# Altium schematic symbol library jlcpcb_2025_04_resistors_extended_1210.schlib: 2670 symbols (part 10 of 14) (continued)
## RC1210FR-071K5L
designator R?  Resistance: 1.5kΩ  (hidden comment: *)
Resistor, 1.5kΩ, ±1%, 500mW, 200V, ±100ppm/℃, -55℃~+155℃, SMD 1210; Manufacturer: Uniroyal; Manufacturer Part Number: RC1210FR-071K5L; Supplier 1: LCSC; Supplier Part Number 1: C309587; JLCPCB Part Number: C309587; Power Rating: 500mW; Category: Resistors; Package Size: 1210; JLCPCB Basic Part: Yes; Tolerance: ±1%; Voltage Rating: 200V; Temperature Coefficient: ±100ppm/℃; Temperature Rating: -55℃~+155℃; ComponentLink1Description: Datasheet; ComponentLink1URL: https://wmsc.lcsc.com/wmsc/upload/file/pdf/v2/lcsc/2304140030_YAGEO-RC1210FR-071K5L_C309587.pdf; ComponentLink2Description: JLCPCB Part URL; ComponentLink2URL: https://jlcpcb.com/partdetail/C309587
pins: 1, 2
1 alternate drawing of the same symbol

## RC1210FR-071K6L
designator R?  Resistance: 1.6kΩ  (hidden comment: *)
Resistor, 1.6kΩ, ±1%, 500mW, 200V, ±100ppm/℃, -55℃~+155℃, SMD 1210; Manufacturer: Uniroyal; Manufacturer Part Number: RC1210FR-071K6L; Supplier 1: LCSC; Supplier Part Number 1: C723540; JLCPCB Part Number: C723540; Power Rating: 500mW; Category: Resistors; Package Size: 1210; JLCPCB Basic Part: Yes; Tolerance: ±1%; Voltage Rating: 200V; Temperature Coefficient: ±100ppm/℃; Temperature Rating: -55℃~+155℃; ComponentLink1Description: Datasheet; ComponentLink1URL: https://wmsc.lcsc.com/wmsc/upload/file/pdf/v2/lcsc/2008171307_YAGEO-RC1210FR-071K6L_C723540.pdf; ComponentLink2Description: JLCPCB Part URL; ComponentLink2URL: https://jlcpcb.com/partdetail/C723540
pins: 1, 2
1 alternate drawing of the same symbol

## RC1210FR-071K8L
designator R?  Resistance: 1.8kΩ  (hidden comment: *)
Resistor, 1.8kΩ, ±1%, 500mW, 200V, ±100ppm/℃, -55℃~+155℃, SMD 1210; Manufacturer: Uniroyal; Manufacturer Part Number: RC1210FR-071K8L; Supplier 1: LCSC; Supplier Part Number 1: C137101; JLCPCB Part Number: C137101; Power Rating: 500mW; Category: Resistors; Package Size: 1210; JLCPCB Basic Part: Yes; Tolerance: ±1%; Voltage Rating: 200V; Temperature Coefficient: ±100ppm/℃; Temperature Rating: -55℃~+155℃; ComponentLink1Description: Datasheet; ComponentLink1URL: https://wmsc.lcsc.com/wmsc/upload/file/pdf/v2/lcsc/2304140030_YAGEO-RC1210FR-071K8L_C137101.pdf; ComponentLink2Description: JLCPCB Part URL; ComponentLink2URL: https://jlcpcb.com/partdetail/C137101
pins: 1, 2
1 alternate drawing of the same symbol

## RC1210FR-071K37L
designator R?  Resistance: 1.37kΩ  (hidden comment: *)
Resistor, 1.37kΩ, ±1%, 500mW, ±100ppm/℃, -55℃~+155℃, SMD 1210; Manufacturer: Uniroyal; Manufacturer Part Number: RC1210FR-071K37L; Supplier 1: LCSC; Supplier Part Number 1: C724010; JLCPCB Part Number: C724010; Power Rating: 500mW; Category: Resistors; Package Size: 1210; JLCPCB Basic Part: Yes; Tolerance: ±1%; Temperature Coefficient: ±100ppm/℃; Temperature Rating: -55℃~+155℃; ComponentLink1Description: Datasheet; ComponentLink1URL: https://wmsc.lcsc.com/wmsc/upload/file/pdf/v2/lcsc/2009261810_YAGEO-RC1210FR-071K37L_C724010.pdf; ComponentLink2Description: JLCPCB Part URL; ComponentLink2URL: https://jlcpcb.com/partdetail/C724010
pins: 1, 2
1 alternate drawing of the same symbol

## RC1210FR-071KL
designator R?  Resistance: 1kΩ  (hidden comment: *)
Resistor, 1kΩ, ±1%, 500mW, 200V, ±100ppm/℃, -55℃~+155℃, SMD 1210; Manufacturer: Uniroyal; Manufacturer Part Number: RC1210FR-071KL; Supplier 1: LCSC; Supplier Part Number 1: C83144; JLCPCB Part Number: C83144; Power Rating: 500mW; Category: Resistors; Package Size: 1210; JLCPCB Basic Part: Yes; Tolerance: ±1%; Voltage Rating: 200V; Temperature Coefficient: ±100ppm/℃; Temperature Rating: -55℃~+155℃; ComponentLink1Description: Datasheet; ComponentLink1URL: https://wmsc.lcsc.com/wmsc/upload/file/pdf/v2/lcsc/1912111437_YAGEO-RC1210FR-071KL_C83144.pdf; ComponentLink2Description: JLCPCB Part URL; ComponentLink2URL: https://jlcpcb.com/partdetail/C83144
pins: 1, 2
1 alternate drawing of the same symbol

## RC1210FR-071ML
designator R?  Resistance: 1MΩ  (hidden comment: *)
Resistor, 1MΩ, ±1%, 500mW, 200V, ±100ppm/℃, -55℃~+155℃, SMD 1210; Manufacturer: Uniroyal; Manufacturer Part Number: RC1210FR-071ML; Supplier 1: LCSC; Supplier Part Number 1: C470029; JLCPCB Part Number: C470029; Power Rating: 500mW; Category: Resistors; Package Size: 1210; JLCPCB Basic Part: Yes; Tolerance: ±1%; Voltage Rating: 200V; Temperature Coefficient: ±100ppm/℃; Temperature Rating: -55℃~+155℃; ComponentLink1Description: Datasheet; ComponentLink1URL: https://wmsc.lcsc.com/wmsc/upload/file/pdf/v2/lcsc/2311211102_YAGEO-RC1210FR-071ML_C470029.pdf; ComponentLink2Description: JLCPCB Part URL; ComponentLink2URL: https://jlcpcb.com/partdetail/C470029
pins: 1, 2
1 alternate drawing of the same symbol

## RC1210FR-071R8L
designator R?  Resistance: 1.8Ω  (hidden comment: *)
Resistor, 1.8Ω, ±1%, 500mW, 200V, ±200ppm/℃, -55℃~+155℃, SMD 1210; Manufacturer: Uniroyal; Manufacturer Part Number: RC1210FR-071R8L; Supplier 1: LCSC; Supplier Part Number 1: C728366; JLCPCB Part Number: C728366; Power Rating: 500mW; Category: Resistors; Package Size: 1210; JLCPCB Basic Part: Yes; Tolerance: ±1%; Voltage Rating: 200V; Temperature Coefficient: ±200ppm/℃; Temperature Rating: -55℃~+155℃; ComponentLink1Description: Datasheet; ComponentLink1URL: https://wmsc.lcsc.com/wmsc/upload/file/pdf/v2/lcsc/2304140030_YAGEO-RC1210FR-071R8L_C728366.pdf; ComponentLink2Description: JLCPCB Part URL; ComponentLink2URL: https://jlcpcb.com/partdetail/C728366
pins: 1, 2
1 alternate drawing of the same symbol

## RC1210FR-071RL
designator R?  Resistance: 1Ω  (hidden comment: *)
Resistor, 1Ω, ±1%, 500mW, 200V, ±200ppm/℃, -55℃~+155℃, SMD 1210; Manufacturer: Uniroyal; Manufacturer Part Number: RC1210FR-071RL; Supplier 1: LCSC; Supplier Part Number 1: C326624; JLCPCB Part Number: C326624; Power Rating: 500mW; Category: Resistors; Package Size: 1210; JLCPCB Basic Part: Yes; Tolerance: ±1%; Voltage Rating: 200V; Temperature Coefficient: ±200ppm/℃; Temperature Rating: -55℃~+155℃; ComponentLink1Description: Datasheet; ComponentLink1URL: https://wmsc.lcsc.com/wmsc/upload/file/pdf/v2/lcsc/1811141241_YAGEO-RC1210FR-071RL_C326624.pdf; ComponentLink2Description: JLCPCB Part URL; ComponentLink2URL: https://jlcpcb.com/partdetail/C326624
pins: 1, 2
1 alternate drawing of the same symbol

## RC1210FR-072K2L
designator R?  Resistance: 2.2kΩ  (hidden comment: *)
Resistor, 2.2kΩ, ±1%, 500mW, 200V, ±100ppm/℃, -55℃~+155℃, SMD 1210; Manufacturer: Uniroyal; Manufacturer Part Number: RC1210FR-072K2L; Supplier 1: LCSC; Supplier Part Number 1: C137098; JLCPCB Part Number: C137098; Power Rating: 500mW; Category: Resistors; Package Size: 1210; JLCPCB Basic Part: Yes; Tolerance: ±1%; Voltage Rating: 200V; Temperature Coefficient: ±100ppm/℃; Temperature Rating: -55℃~+155℃; ComponentLink1Description: Datasheet; ComponentLink1URL: https://wmsc.lcsc.com/wmsc/upload/file/pdf/v2/lcsc/2304140030_YAGEO-RC1210FR-072K2L_C137098.pdf; ComponentLink2Description: JLCPCB Part URL; ComponentLink2URL: https://jlcpcb.com/partdetail/C137098
pins: 1, 2
1 alternate drawing of the same symbol

## RC1210FR-072K7L
designator R?  Resistance: 2.7kΩ  (hidden comment: *)
Resistor, 2.7kΩ, ±1%, 500mW, 200V, ±100ppm/℃, -55℃~+155℃, SMD 1210; Manufacturer: Uniroyal; Manufacturer Part Number: RC1210FR-072K7L; Supplier 1: LCSC; Supplier Part Number 1: C728372; JLCPCB Part Number: C728372; Power Rating: 500mW; Category: Resistors; Package Size: 1210; JLCPCB Basic Part: Yes; Tolerance: ±1%; Voltage Rating: 200V; Temperature Coefficient: ±100ppm/℃; Temperature Rating: -55℃~+155℃; ComponentLink1Description: Datasheet; ComponentLink1URL: https://wmsc.lcsc.com/wmsc/upload/file/pdf/v2/lcsc/2304140030_YAGEO-RC1210FR-072K7L_C728372.pdf; ComponentLink2Description: JLCPCB Part URL; ComponentLink2URL: https://jlcpcb.com/partdetail/C728372
pins: 1, 2
1 alternate drawing of the same symbol

## RC1210FR-072K26L
designator R?  Resistance: 2.26kΩ  (hidden comment: *)
Resistor, 2.26kΩ, ±1%, 500mW, ±100ppm/℃, -55℃~+155℃, SMD 1210; Manufacturer: Uniroyal; Manufacturer Part Number: RC1210FR-072K26L; Supplier 1: LCSC; Supplier Part Number 1: C728371; JLCPCB Part Number: C728371; Power Rating: 500mW; Category: Resistors; Package Size: 1210; JLCPCB Basic Part: Yes; Tolerance: ±1%; Temperature Coefficient: ±100ppm/℃; Temperature Rating: -55℃~+155℃; ComponentLink1Description: Datasheet; ComponentLink1URL: https://wmsc.lcsc.com/wmsc/upload/file/pdf/v2/lcsc/2304140030_YAGEO-RC1210FR-072K26L_C728371.pdf; ComponentLink2Description: JLCPCB Part URL; ComponentLink2URL: https://jlcpcb.com/partdetail/C728371
pins: 1, 2
1 alternate drawing of the same symbol

## RC1210FR-072K49L
designator R?  Resistance: 2.49kΩ  (hidden comment: *)
Resistor, 2.49kΩ, ±1%, 500mW, 200V, ±100ppm/℃, -55℃~+155℃, SMD 1210; Manufacturer: Uniroyal; Manufacturer Part Number: RC1210FR-072K49L; Supplier 1: LCSC; Supplier Part Number 1: C705453; JLCPCB Part Number: C705453; Power Rating: 500mW; Category: Resistors; Package Size: 1210; JLCPCB Basic Part: Yes; Tolerance: ±1%; Voltage Rating: 200V; Temperature Coefficient: ±100ppm/℃; Temperature Rating: -55℃~+155℃; ComponentLink1Description: Datasheet; ComponentLink1URL: https://wmsc.lcsc.com/wmsc/upload/file/pdf/v2/lcsc/2304140030_YAGEO-RC1210FR-072K49L_C705453.pdf; ComponentLink2Description: JLCPCB Part URL; ComponentLink2URL: https://jlcpcb.com/partdetail/C705453
pins: 1, 2
1 alternate drawing of the same symbol

## RC1210FR-072KL
designator R?  Resistance: 2kΩ  (hidden comment: *)
Resistor, 2kΩ, ±1%, 500mW, 200V, ±100ppm/℃, -55℃~+155℃, SMD 1210; Manufacturer: Uniroyal; Manufacturer Part Number: RC1210FR-072KL; Supplier 1: LCSC; Supplier Part Number 1: C137097; JLCPCB Part Number: C137097; Power Rating: 500mW; Category: Resistors; Package Size: 1210; JLCPCB Basic Part: Yes; Tolerance: ±1%; Voltage Rating: 200V; Temperature Coefficient: ±100ppm/℃; Temperature Rating: -55℃~+155℃; ComponentLink1Description: Datasheet; ComponentLink1URL: https://wmsc.lcsc.com/wmsc/upload/file/pdf/v2/lcsc/2304140030_YAGEO-RC1210FR-072KL_C137097.pdf; ComponentLink2Description: JLCPCB Part URL; ComponentLink2URL: https://jlcpcb.com/partdetail/C137097
pins: 1, 2
1 alternate drawing of the same symbol

## RC1210FR-072R2L
designator R?  Resistance: 2.2Ω  (hidden comment: *)
Resistor, 2.2Ω, ±1%, 500mW, 200V, ±200ppm/℃, -55℃~+155℃, SMD 1210; Manufacturer: Uniroyal; Manufacturer Part Number: RC1210FR-072R2L; Supplier 1: LCSC; Supplier Part Number 1: C513568; JLCPCB Part Number: C513568; Power Rating: 500mW; Category: Resistors; Package Size: 1210; JLCPCB Basic Part: Yes; Tolerance: ±1%; Voltage Rating: 200V; Temperature Coefficient: ±200ppm/℃; Temperature Rating: -55℃~+155℃; ComponentLink1Description: Datasheet; ComponentLink1URL: https://wmsc.lcsc.com/wmsc/upload/file/pdf/v2/lcsc/2304140030_YAGEO-RC1210FR-072R2L_C513568.pdf; ComponentLink2Description: JLCPCB Part URL; ComponentLink2URL: https://jlcpcb.com/partdetail/C513568
pins: 1, 2
1 alternate drawing of the same symbol

## RC1210FR-072R21L
designator R?  Resistance: 2.21Ω  (hidden comment: *)
Resistor, 2.21Ω, ±1%, 500mW, 200V, ±200ppm/℃, -55℃~+155℃, SMD 1210; Manufacturer: Uniroyal; Manufacturer Part Number: RC1210FR-072R21L; Supplier 1: LCSC; Supplier Part Number 1: C606193; JLCPCB Part Number: C606193; Power Rating: 500mW; Category: Resistors; Package Size: 1210; JLCPCB Basic Part: Yes; Tolerance: ±1%; Voltage Rating: 200V; Temperature Coefficient: ±200ppm/℃; Temperature Rating: -55℃~+155℃; ComponentLink1Description: Datasheet; ComponentLink1URL: https://wmsc.lcsc.com/wmsc/upload/file/pdf/v2/lcsc/2006112331_YAGEO-RC1210FR-072R21L_C606193.pdf; ComponentLink2Description: JLCPCB Part URL; ComponentLink2URL: https://jlcpcb.com/partdetail/C606193
pins: 1, 2
1 alternate drawing of the same symbol

## RC1210FR-072RL
designator R?  Resistance: 2Ω  (hidden comment: *)
Resistor, 2Ω, ±1%, 500mW, 200V, ±200ppm/℃, -55℃~+155℃, SMD 1210; Manufacturer: Uniroyal; Manufacturer Part Number: RC1210FR-072RL; Supplier 1: LCSC; Supplier Part Number 1: C723451; JLCPCB Part Number: C723451; Power Rating: 500mW; Category: Resistors; Package Size: 1210; JLCPCB Basic Part: Yes; Tolerance: ±1%; Voltage Rating: 200V; Temperature Coefficient: ±200ppm/℃; Temperature Rating: -55℃~+155℃; ComponentLink1Description: Datasheet; ComponentLink1URL: https://wmsc.lcsc.com/wmsc/upload/file/pdf/v2/lcsc/2008171306_YAGEO-RC1210FR-072RL_C723451.pdf; ComponentLink2Description: JLCPCB Part URL; ComponentLink2URL: https://jlcpcb.com/partdetail/C723451
pins: 1, 2
1 alternate drawing of the same symbol

## RC1210FR-073K6L
designator R?  Resistance: 3.6kΩ  (hidden comment: *)
Resistor, 3.6kΩ, ±1%, 500mW, ±100ppm/℃, -55℃~+155℃, SMD 1210; Manufacturer: Uniroyal; Manufacturer Part Number: RC1210FR-073K6L; Supplier 1: LCSC; Supplier Part Number 1: C728379; JLCPCB Part Number: C728379; Power Rating: 500mW; Category: Resistors; Package Size: 1210; JLCPCB Basic Part: Yes; Tolerance: ±1%; Temperature Coefficient: ±100ppm/℃; Temperature Rating: -55℃~+155℃; ComponentLink1Description: Datasheet; ComponentLink1URL: https://wmsc.lcsc.com/wmsc/upload/file/pdf/v2/lcsc/2304140030_YAGEO-RC1210FR-073K6L_C728379.pdf; ComponentLink2Description: JLCPCB Part URL; ComponentLink2URL: https://jlcpcb.com/partdetail/C728379
pins: 1, 2
1 alternate drawing of the same symbol

## RC1210FR-073K9L
designator R?  Resistance: 3.9kΩ  (hidden comment: *)
Resistor, 3.9kΩ, ±1%, 500mW, 200V, ±100ppm/℃, -55℃~+155℃, SMD 1210; Manufacturer: Uniroyal; Manufacturer Part Number: RC1210FR-073K9L; Supplier 1: LCSC; Supplier Part Number 1: C728380; JLCPCB Part Number: C728380; Power Rating: 500mW; Category: Resistors; Package Size: 1210; JLCPCB Basic Part: Yes; Tolerance: ±1%; Voltage Rating: 200V; Temperature Coefficient: ±100ppm/℃; Temperature Rating: -55℃~+155℃; ComponentLink1Description: Datasheet; ComponentLink1URL: https://wmsc.lcsc.com/wmsc/upload/file/pdf/v2/lcsc/2304140030_YAGEO-RC1210FR-073K9L_C728380.pdf; ComponentLink2Description: JLCPCB Part URL; ComponentLink2URL: https://jlcpcb.com/partdetail/C728380
pins: 1, 2
1 alternate drawing of the same symbol

## RC1210FR-073K65L
designator R?  Resistance: 3.65kΩ  (hidden comment: *)
Resistor, 3.65kΩ, ±1%, 500mW, 200V, ±100ppm/℃, -55℃~+155℃, SMD 1210; Manufacturer: Uniroyal; Manufacturer Part Number: RC1210FR-073K65L; Supplier 1: LCSC; Supplier Part Number 1: C326795; JLCPCB Part Number: C326795; Power Rating: 500mW; Category: Resistors; Package Size: 1210; JLCPCB Basic Part: Yes; Tolerance: ±1%; Voltage Rating: 200V; Temperature Coefficient: ±100ppm/℃; Temperature Rating: -55℃~+155℃; ComponentLink1Description: Datasheet; ComponentLink1URL: https://wmsc.lcsc.com/wmsc/upload/file/pdf/v2/lcsc/2304140030_YAGEO-RC1210FR-073K65L_C326795.pdf; ComponentLink2Description: JLCPCB Part URL; ComponentLink2URL: https://jlcpcb.com/partdetail/C326795
pins: 1, 2
1 alternate drawing of the same symbol

## RC1210FR-073KL
designator R?  Resistance: 3kΩ  (hidden comment: *)
Resistor, 3kΩ, ±1%, 500mW, 200V, ±100ppm/℃, -55℃~+155℃, SMD 1210; Manufacturer: Uniroyal; Manufacturer Part Number: RC1210FR-073KL; Supplier 1: LCSC; Supplier Part Number 1: C326796; JLCPCB Part Number: C326796; Power Rating: 500mW; Category: Resistors; Package Size: 1210; JLCPCB Basic Part: Yes; Tolerance: ±1%; Voltage Rating: 200V; Temperature Coefficient: ±100ppm/℃; Temperature Rating: -55℃~+155℃; ComponentLink1Description: Datasheet; ComponentLink1URL: https://wmsc.lcsc.com/wmsc/upload/file/pdf/v2/lcsc/2304140030_YAGEO-RC1210FR-073KL_C326796.pdf; ComponentLink2Description: JLCPCB Part URL; ComponentLink2URL: https://jlcpcb.com/partdetail/C326796
pins: 1, 2
1 alternate drawing of the same symbol

## RC1210FR-073R3L
designator R?  Resistance: 3.3Ω  (hidden comment: *)
Resistor, 3.3Ω, ±1%, 500mW, 200V, ±200ppm/℃, -55℃~+155℃, SMD 1210; Manufacturer: Uniroyal; Manufacturer Part Number: RC1210FR-073R3L; Supplier 1: LCSC; Supplier Part Number 1: C606194; JLCPCB Part Number: C606194; Power Rating: 500mW; Category: Resistors; Package Size: 1210; JLCPCB Basic Part: Yes; Tolerance: ±1%; Voltage Rating: 200V; Temperature Coefficient: ±200ppm/℃; Temperature Rating: -55℃~+155℃; ComponentLink1Description: Datasheet; ComponentLink1URL: https://wmsc.lcsc.com/wmsc/upload/file/pdf/v2/lcsc/2006112331_YAGEO-RC1210FR-073R3L_C606194.pdf; ComponentLink2Description: JLCPCB Part URL; ComponentLink2URL: https://jlcpcb.com/partdetail/C606194
pins: 1, 2
1 alternate drawing of the same symbol

## RC1210FR-073R6L
designator R?  Resistance: 3.6Ω  (hidden comment: *)
Resistor, 3.6Ω, ±1%, 500mW, ±200ppm/℃, -55℃~+155℃, SMD 1210; Manufacturer: Uniroyal; Manufacturer Part Number: RC1210FR-073R6L; Supplier 1: LCSC; Supplier Part Number 1: C723576; JLCPCB Part Number: C723576; Power Rating: 500mW; Category: Resistors; Package Size: 1210; JLCPCB Basic Part: Yes; Tolerance: ±1%; Temperature Coefficient: ±200ppm/℃; Temperature Rating: -55℃~+155℃; ComponentLink1Description: Datasheet; ComponentLink1URL: https://wmsc.lcsc.com/wmsc/upload/file/pdf/v2/lcsc/2008171334_YAGEO-RC1210FR-073R6L_C723576.pdf; ComponentLink2Description: JLCPCB Part URL; ComponentLink2URL: https://jlcpcb.com/partdetail/C723576
pins: 1, 2
1 alternate drawing of the same symbol

## RC1210FR-073R9L
designator R?  Resistance: 3.9Ω  (hidden comment: *)
Resistor, 3.9Ω, ±1%, 500mW, 200V, ±200ppm/℃, -55℃~+155℃, SMD 1210; Manufacturer: Uniroyal; Manufacturer Part Number: RC1210FR-073R9L; Supplier 1: LCSC; Supplier Part Number 1: C874980; JLCPCB Part Number: C874980; Power Rating: 500mW; Category: Resistors; Package Size: 1210; JLCPCB Basic Part: Yes; Tolerance: ±1%; Voltage Rating: 200V; Temperature Coefficient: ±200ppm/℃; Temperature Rating: -55℃~+155℃; ComponentLink1Description: Datasheet; ComponentLink1URL: https://wmsc.lcsc.com/wmsc/upload/file/pdf/v2/lcsc/2201041830_YAGEO-RC1210FR-073R9L_C874980.pdf; ComponentLink2Description: JLCPCB Part URL; ComponentLink2URL: https://jlcpcb.com/partdetail/C874980
pins: 1, 2
1 alternate drawing of the same symbol

## RC1210FR-073RL
designator R?  Resistance: 3Ω  (hidden comment: *)
Resistor, 3Ω, ±1%, 500mW, 200V, ±200ppm/℃, -55℃~+155℃, SMD 1210; Manufacturer: Uniroyal; Manufacturer Part Number: RC1210FR-073RL; Supplier 1: LCSC; Supplier Part Number 1: C723648; JLCPCB Part Number: C723648; Power Rating: 500mW; Category: Resistors; Package Size: 1210; JLCPCB Basic Part: Yes; Tolerance: ±1%; Voltage Rating: 200V; Temperature Coefficient: ±200ppm/℃; Temperature Rating: -55℃~+155℃; ComponentLink1Description: Datasheet; ComponentLink1URL: https://wmsc.lcsc.com/wmsc/upload/file/pdf/v2/lcsc/2008171335_YAGEO-RC1210FR-073RL_C723648.pdf; ComponentLink2Description: JLCPCB Part URL; ComponentLink2URL: https://jlcpcb.com/partdetail/C723648
pins: 1, 2
1 alternate drawing of the same symbol

## RC1210FR-074K3L
designator R?  Resistance: 4.3kΩ  (hidden comment: *)
Resistor, 4.3kΩ, ±1%, 500mW, 200V, ±100ppm/℃, -55℃~+155℃, SMD 1210; Manufacturer: Uniroyal; Manufacturer Part Number: RC1210FR-074K3L; Supplier 1: LCSC; Supplier Part Number 1: C309588; JLCPCB Part Number: C309588; Power Rating: 500mW; Category: Resistors; Package Size: 1210; JLCPCB Basic Part: Yes; Tolerance: ±1%; Voltage Rating: 200V; Temperature Coefficient: ±100ppm/℃; Temperature Rating: -55℃~+155℃; ComponentLink1Description: Datasheet; ComponentLink1URL: https://wmsc.lcsc.com/wmsc/upload/file/pdf/v2/lcsc/2304140030_YAGEO-RC1210FR-074K3L_C309588.pdf; ComponentLink2Description: JLCPCB Part URL; ComponentLink2URL: https://jlcpcb.com/partdetail/C309588
pins: 1, 2
1 alternate drawing of the same symbol

## RC1210FR-074K7L
designator R?  Resistance: 4.7kΩ  (hidden comment: *)
Resistor, 4.7kΩ, ±1%, 500mW, 200V, ±100ppm/℃, -55℃~+155℃, SMD 1210; Manufacturer: Uniroyal; Manufacturer Part Number: RC1210FR-074K7L; Supplier 1: LCSC; Supplier Part Number 1: C83147; JLCPCB Part Number: C83147; Power Rating: 500mW; Category: Resistors; Package Size: 1210; JLCPCB Basic Part: Yes; Tolerance: ±1%; Voltage Rating: 200V; Temperature Coefficient: ±100ppm/℃; Temperature Rating: -55℃~+155℃; ComponentLink1Description: Datasheet; ComponentLink1URL: https://wmsc.lcsc.com/wmsc/upload/file/pdf/v2/lcsc/2311211102_YAGEO-RC1210FR-074K7L_C83147.pdf; ComponentLink2Description: JLCPCB Part URL; ComponentLink2URL: https://jlcpcb.com/partdetail/C83147
pins: 1, 2
1 alternate drawing of the same symbol

## RC1210FR-074K99L
designator R?  Resistance: 4.99kΩ  (hidden comment: *)
Resistor, 4.99kΩ, ±1%, 500mW, 200V, ±100ppm/℃, -55℃~+155℃, SMD 1210; Manufacturer: Uniroyal; Manufacturer Part Number: RC1210FR-074K99L; Supplier 1: LCSC; Supplier Part Number 1: C137093; JLCPCB Part Number: C137093; Power Rating: 500mW; Category: Resistors; Package Size: 1210; JLCPCB Basic Part: Yes; Tolerance: ±1%; Voltage Rating: 200V; Temperature Coefficient: ±100ppm/℃; Temperature Rating: -55℃~+155℃; ComponentLink1Description: Datasheet; ComponentLink1URL: https://wmsc.lcsc.com/wmsc/upload/file/pdf/v2/lcsc/2304140030_YAGEO-RC1210FR-074K99L_C137093.pdf; ComponentLink2Description: JLCPCB Part URL; ComponentLink2URL: https://jlcpcb.com/partdetail/C137093
pins: 1, 2
1 alternate drawing of the same symbol

## RC1210FR-074R3L
designator R?  Resistance: 4.3Ω  (hidden comment: *)
Resistor, 4.3Ω, ±1%, 500mW, 200V, ±200ppm/℃, -55℃~+155℃, SMD 1210; Manufacturer: Uniroyal; Manufacturer Part Number: RC1210FR-074R3L; Supplier 1: LCSC; Supplier Part Number 1: C728385; JLCPCB Part Number: C728385; Power Rating: 500mW; Category: Resistors; Package Size: 1210; JLCPCB Basic Part: Yes; Tolerance: ±1%; Voltage Rating: 200V; Temperature Coefficient: ±200ppm/℃; Temperature Rating: -55℃~+155℃; ComponentLink1Description: Datasheet; ComponentLink1URL: https://wmsc.lcsc.com/wmsc/upload/file/pdf/v2/lcsc/2304140030_YAGEO-RC1210FR-074R3L_C728385.pdf; ComponentLink2Description: JLCPCB Part URL; ComponentLink2URL: https://jlcpcb.com/partdetail/C728385
pins: 1, 2
1 alternate drawing of the same symbol

## RC1210FR-074R7L
designator R?  Resistance: 4.7Ω  (hidden comment: *)
Resistor, 4.7Ω, ±1%, 500mW, 200V, ±200ppm/℃, -55℃~+155℃, SMD 1210; Manufacturer: Uniroyal; Manufacturer Part Number: RC1210FR-074R7L; Supplier 1: LCSC; Supplier Part Number 1: C728386; JLCPCB Part Number: C728386; Power Rating: 500mW; Category: Resistors; Package Size: 1210; JLCPCB Basic Part: Yes; Tolerance: ±1%; Voltage Rating: 200V; Temperature Coefficient: ±200ppm/℃; Temperature Rating: -55℃~+155℃; ComponentLink1Description: Datasheet; ComponentLink1URL: https://wmsc.lcsc.com/wmsc/upload/file/pdf/v2/lcsc/2304140030_YAGEO-RC1210FR-074R7L_C728386.pdf; ComponentLink2Description: JLCPCB Part URL; ComponentLink2URL: https://jlcpcb.com/partdetail/C728386
pins: 1, 2
1 alternate drawing of the same symbol

## RC1210FR-075K1L
designator R?  Resistance: 5.1kΩ  (hidden comment: *)
Resistor, 5.1kΩ, ±1%, 500mW, 200V, ±100ppm/℃, -55℃~+155℃, SMD 1210; Manufacturer: Uniroyal; Manufacturer Part Number: RC1210FR-075K1L; Supplier 1: LCSC; Supplier Part Number 1: C728389; JLCPCB Part Number: C728389; Power Rating: 500mW; Category: Resistors; Package Size: 1210; JLCPCB Basic Part: Yes; Tolerance: ±1%; Voltage Rating: 200V; Temperature Coefficient: ±100ppm/℃; Temperature Rating: -55℃~+155℃; ComponentLink1Description: Datasheet; ComponentLink1URL: https://wmsc.lcsc.com/wmsc/upload/file/pdf/v2/lcsc/2304140030_YAGEO-RC1210FR-075K1L_C728389.pdf; ComponentLink2Description: JLCPCB Part URL; ComponentLink2URL: https://jlcpcb.com/partdetail/C728389
pins: 1, 2
1 alternate drawing of the same symbol

## RC1210FR-075K6L
designator R?  Resistance: 5.6kΩ  (hidden comment: *)
Resistor, 5.6kΩ, ±1%, 500mW, 200V, ±100ppm/℃, -55℃~+155℃, SMD 1210; Manufacturer: Uniroyal; Manufacturer Part Number: RC1210FR-075K6L; Supplier 1: LCSC; Supplier Part Number 1: C705455; JLCPCB Part Number: C705455; Power Rating: 500mW; Category: Resistors; Package Size: 1210; JLCPCB Basic Part: Yes; Tolerance: ±1%; Voltage Rating: 200V; Temperature Coefficient: ±100ppm/℃; Temperature Rating: -55℃~+155℃; ComponentLink1Description: Datasheet; ComponentLink1URL: https://wmsc.lcsc.com/wmsc/upload/file/pdf/v2/lcsc/2304140030_YAGEO-RC1210FR-075K6L_C705455.pdf; ComponentLink2Description: JLCPCB Part URL; ComponentLink2URL: https://jlcpcb.com/partdetail/C705455
pins: 1, 2
1 alternate drawing of the same symbol

## RC1210FR-075R1L
designator R?  Resistance: 5.1Ω  (hidden comment: *)
Resistor, 5.1Ω, ±1%, 500mW, 200V, ±200ppm/℃, -55℃~+155℃, SMD 1210; Manufacturer: Uniroyal; Manufacturer Part Number: RC1210FR-075R1L; Supplier 1: LCSC; Supplier Part Number 1: C137092; JLCPCB Part Number: C137092; Power Rating: 500mW; Category: Resistors; Package Size: 1210; JLCPCB Basic Part: Yes; Tolerance: ±1%; Voltage Rating: 200V; Temperature Coefficient: ±200ppm/℃; Temperature Rating: -55℃~+155℃; ComponentLink1Description: Datasheet; ComponentLink1URL: https://wmsc.lcsc.com/wmsc/upload/file/pdf/v2/lcsc/2304140030_YAGEO-RC1210FR-075R1L_C137092.pdf; ComponentLink2Description: JLCPCB Part URL; ComponentLink2URL: https://jlcpcb.com/partdetail/C137092
pins: 1, 2
1 alternate drawing of the same symbol

## RC1210FR-075R6L
designator R?  Resistance: 5.6Ω  (hidden comment: *)
Resistor, 5.6Ω, ±1%, 500mW, 200V, ±200ppm/℃, -55℃~+155℃, SMD 1210; Manufacturer: Uniroyal; Manufacturer Part Number: RC1210FR-075R6L; Supplier 1: LCSC; Supplier Part Number 1: C309590; JLCPCB Part Number: C309590; Power Rating: 500mW; Category: Resistors; Package Size: 1210; JLCPCB Basic Part: Yes; Tolerance: ±1%; Voltage Rating: 200V; Temperature Coefficient: ±200ppm/℃; Temperature Rating: -55℃~+155℃; ComponentLink1Description: Datasheet; ComponentLink1URL: https://wmsc.lcsc.com/wmsc/upload/file/pdf/v2/lcsc/2304140030_YAGEO-RC1210FR-075R6L_C309590.pdf; ComponentLink2Description: JLCPCB Part URL; ComponentLink2URL: https://jlcpcb.com/partdetail/C309590
pins: 1, 2
1 alternate drawing of the same symbol

## RC1210FR-076K8L
designator R?  Resistance: 6.8kΩ  (hidden comment: *)
Resistor, 6.8kΩ, ±1%, 500mW, 200V, ±100ppm/℃, -55℃~+155℃, SMD 1210; Manufacturer: Uniroyal; Manufacturer Part Number: RC1210FR-076K8L; Supplier 1: LCSC; Supplier Part Number 1: C326792; JLCPCB Part Number: C326792; Power Rating: 500mW; Category: Resistors; Package Size: 1210; JLCPCB Basic Part: Yes; Tolerance: ±1%; Voltage Rating: 200V; Temperature Coefficient: ±100ppm/℃; Temperature Rating: -55℃~+155℃; ComponentLink1Description: Datasheet; ComponentLink1URL: https://wmsc.lcsc.com/wmsc/upload/file/pdf/v2/lcsc/2304140030_YAGEO-RC1210FR-076K8L_C326792.pdf; ComponentLink2Description: JLCPCB Part URL; ComponentLink2URL: https://jlcpcb.com/partdetail/C326792
pins: 1, 2
1 alternate drawing of the same symbol

## RC1210FR-076R8L
designator R?  Resistance: 6.8Ω  (hidden comment: *)
Resistor, 6.8Ω, ±1%, 500mW, ±200ppm/℃, -55℃~+155℃, SMD 1210; Manufacturer: Uniroyal; Manufacturer Part Number: RC1210FR-076R8L; Supplier 1: LCSC; Supplier Part Number 1: C728393; JLCPCB Part Number: C728393; Power Rating: 500mW; Category: Resistors; Package Size: 1210; JLCPCB Basic Part: Yes; Tolerance: ±1%; Temperature Coefficient: ±200ppm/℃; Temperature Rating: -55℃~+155℃; ComponentLink1Description: Datasheet; ComponentLink1URL: https://wmsc.lcsc.com/wmsc/upload/file/pdf/v2/lcsc/2304140030_YAGEO-RC1210FR-076R8L_C728393.pdf; ComponentLink2Description: JLCPCB Part URL; ComponentLink2URL: https://jlcpcb.com/partdetail/C728393
pins: 1, 2
1 alternate drawing of the same symbol

## RC1210FR-076R65L
designator R?  Resistance: 6.65Ω  (hidden comment: *)
Resistor, 6.65Ω, ±1%, 500mW, 200V, ±200ppm/℃, -55℃~+155℃, SMD 1210; Manufacturer: Uniroyal; Manufacturer Part Number: RC1210FR-076R65L; Supplier 1: LCSC; Supplier Part Number 1: C309592; JLCPCB Part Number: C309592; Power Rating: 500mW; Category: Resistors; Package Size: 1210; JLCPCB Basic Part: Yes; Tolerance: ±1%; Voltage Rating: 200V; Temperature Coefficient: ±200ppm/℃; Temperature Rating: -55℃~+155℃; ComponentLink1Description: Datasheet; ComponentLink1URL: https://wmsc.lcsc.com/wmsc/upload/file/pdf/v2/lcsc/2304140030_YAGEO-RC1210FR-076R65L_C309592.pdf; ComponentLink2Description: JLCPCB Part URL; ComponentLink2URL: https://jlcpcb.com/partdetail/C309592
pins: 1, 2
1 alternate drawing of the same symbol

## RC1210FR-077R5L
designator R?  Resistance: 7.5Ω  (hidden comment: *)
Resistor, 7.5Ω, ±1%, 500mW, 200V, ±200ppm/℃, -55℃~+155℃, SMD 1210; Manufacturer: Uniroyal; Manufacturer Part Number: RC1210FR-077R5L; Supplier 1: LCSC; Supplier Part Number 1: C309593; JLCPCB Part Number: C309593; Power Rating: 500mW; Category: Resistors; Package Size: 1210; JLCPCB Basic Part: Yes; Tolerance: ±1%; Voltage Rating: 200V; Temperature Coefficient: ±200ppm/℃; Temperature Rating: -55℃~+155℃; ComponentLink1Description: Datasheet; ComponentLink1URL: https://wmsc.lcsc.com/wmsc/upload/file/pdf/v2/lcsc/2304140030_YAGEO-RC1210FR-077R5L_C309593.pdf; ComponentLink2Description: JLCPCB Part URL; ComponentLink2URL: https://jlcpcb.com/partdetail/C309593
pins: 1, 2
1 alternate drawing of the same symbol

## RC1210FR-0710KL
designator R?  Resistance: 10kΩ  (hidden comment: *)
Resistor, 10kΩ, ±1%, 500mW, 200V, ±100ppm/℃, -55℃~+155℃, SMD 1210; Manufacturer: Uniroyal; Manufacturer Part Number: RC1210FR-0710KL; Supplier 1: LCSC; Supplier Part Number 1: C309586; JLCPCB Part Number: C309586; Power Rating: 500mW; Category: Resistors; Package Size: 1210; JLCPCB Basic Part: Yes; Tolerance: ±1%; Voltage Rating: 200V; Temperature Coefficient: ±100ppm/℃; Temperature Rating: -55℃~+155℃; ComponentLink1Description: Datasheet; ComponentLink1URL: https://wmsc.lcsc.com/wmsc/upload/file/pdf/v2/lcsc/2304140030_YAGEO-RC1210FR-0710KL_C309586.pdf; ComponentLink2Description: JLCPCB Part URL; ComponentLink2URL: https://jlcpcb.com/partdetail/C309586
pins: 1, 2
1 alternate drawing of the same symbol

## RC1210FR-0710RL
designator R?  Resistance: 10Ω  (hidden comment: *)
Resistor, 10Ω, ±1%, 500mW, 200V, ±200ppm/℃, -55℃~+155℃, SMD 1210; Manufacturer: Uniroyal; Manufacturer Part Number: RC1210FR-0710RL; Supplier 1: LCSC; Supplier Part Number 1: C83141; JLCPCB Part Number: C83141; Power Rating: 500mW; Category: Resistors; Package Size: 1210; JLCPCB Basic Part: Yes; Tolerance: ±1%; Voltage Rating: 200V; Temperature Coefficient: ±200ppm/℃; Temperature Rating: -55℃~+155℃; ComponentLink1Description: Datasheet; ComponentLink1URL: https://wmsc.lcsc.com/wmsc/upload/file/pdf/v2/lcsc/2304140030_YAGEO-RC1210FR-0710RL_C83141.pdf; ComponentLink2Description: JLCPCB Part URL; ComponentLink2URL: https://jlcpcb.com/partdetail/C83141
pins: 1, 2
1 alternate drawing of the same symbol

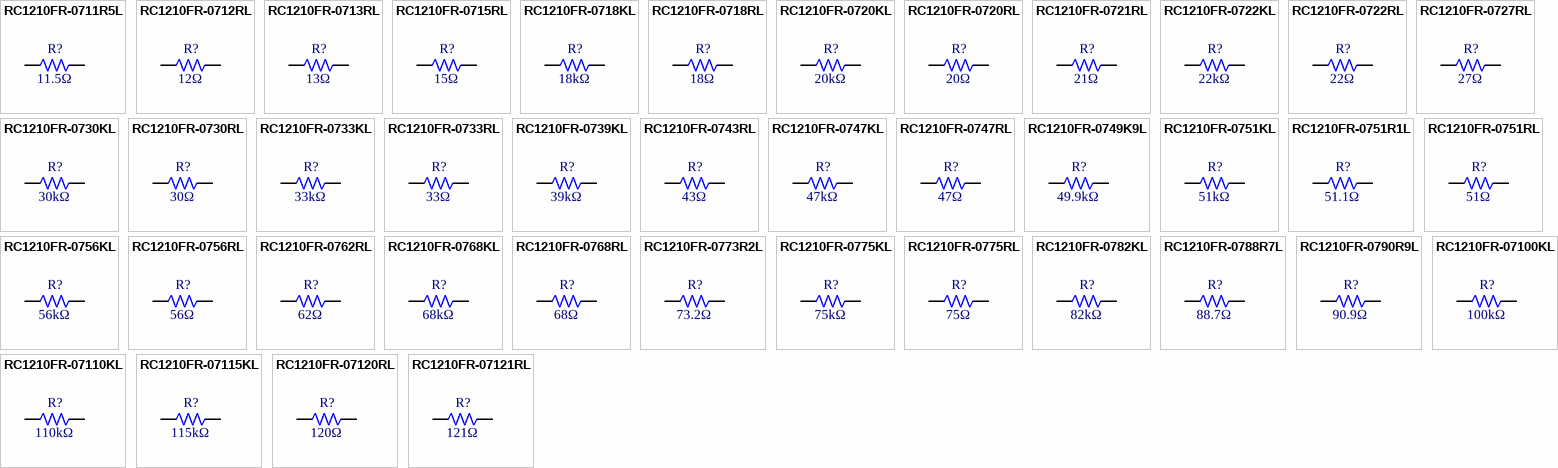
[diagram p47: symbols RC1210FR-0711R5L to RC1210FR-07121RL]

## RC1210FR-0711R5L
designator R?  Resistance: 11.5Ω  (hidden comment: *)
Resistor, 11.5Ω, ±1%, 500mW, ±100ppm/℃, -55℃~+155℃, SMD 1210; Manufacturer: Uniroyal; Manufacturer Part Number: RC1210FR-0711R5L; Supplier 1: LCSC; Supplier Part Number 1: C728359; JLCPCB Part Number: C728359; Power Rating: 500mW; Category: Resistors; Package Size: 1210; JLCPCB Basic Part: Yes; Tolerance: ±1%; Temperature Coefficient: ±100ppm/℃; Temperature Rating: -55℃~+155℃; ComponentLink1Description: Datasheet; ComponentLink1URL: https://wmsc.lcsc.com/wmsc/upload/file/pdf/v2/lcsc/2304140030_YAGEO-RC1210FR-0711R5L_C728359.pdf; ComponentLink2Description: JLCPCB Part URL; ComponentLink2URL: https://jlcpcb.com/partdetail/C728359
pins: 1, 2
1 alternate drawing of the same symbol

## RC1210FR-0712RL
designator R?  Resistance: 12Ω  (hidden comment: *)
Resistor, 12Ω, ±1%, 500mW, 200V, ±100ppm/℃, -55℃~+155℃, SMD 1210; Manufacturer: Uniroyal; Manufacturer Part Number: RC1210FR-0712RL; Supplier 1: LCSC; Supplier Part Number 1: C728361; JLCPCB Part Number: C728361; Power Rating: 500mW; Category: Resistors; Package Size: 1210; JLCPCB Basic Part: Yes; Tolerance: ±1%; Voltage Rating: 200V; Temperature Coefficient: ±100ppm/℃; Temperature Rating: -55℃~+155℃; ComponentLink1Description: Datasheet; ComponentLink1URL: https://wmsc.lcsc.com/wmsc/upload/file/pdf/v2/lcsc/2304140030_YAGEO-RC1210FR-0712RL_C728361.pdf; ComponentLink2Description: JLCPCB Part URL; ComponentLink2URL: https://jlcpcb.com/partdetail/C728361
pins: 1, 2
1 alternate drawing of the same symbol

## RC1210FR-0713RL
designator R?  Resistance: 13Ω  (hidden comment: *)
Resistor, 13Ω, ±1%, 500mW, ±100ppm/℃, -55℃~+155℃, SMD 1210; Manufacturer: Uniroyal; Manufacturer Part Number: RC1210FR-0713RL; Supplier 1: LCSC; Supplier Part Number 1: C874711; JLCPCB Part Number: C874711; Power Rating: 500mW; Category: Resistors; Package Size: 1210; JLCPCB Basic Part: Yes; Tolerance: ±1%; Temperature Coefficient: ±100ppm/℃; Temperature Rating: -55℃~+155℃; ComponentLink1Description: Datasheet; ComponentLink1URL: https://wmsc.lcsc.com/wmsc/upload/file/pdf/v2/lcsc/2311211102_YAGEO-RC1210FR-0713RL_C874711.pdf; ComponentLink2Description: JLCPCB Part URL; ComponentLink2URL: https://jlcpcb.com/partdetail/C874711
pins: 1, 2
1 alternate drawing of the same symbol

## RC1210FR-0715RL
designator R?  Resistance: 15Ω  (hidden comment: *)
Resistor, 15Ω, ±1%, 500mW, 200V, ±100ppm/℃, -55℃~+155℃, SMD 1210; Manufacturer: Uniroyal; Manufacturer Part Number: RC1210FR-0715RL; Supplier 1: LCSC; Supplier Part Number 1: C137102; JLCPCB Part Number: C137102; Power Rating: 500mW; Category: Resistors; Package Size: 1210; JLCPCB Basic Part: Yes; Tolerance: ±1%; Voltage Rating: 200V; Temperature Coefficient: ±100ppm/℃; Temperature Rating: -55℃~+155℃; ComponentLink1Description: Datasheet; ComponentLink1URL: https://wmsc.lcsc.com/wmsc/upload/file/pdf/v2/lcsc/2304140030_YAGEO-RC1210FR-0715RL_C137102.pdf; ComponentLink2Description: JLCPCB Part URL; ComponentLink2URL: https://jlcpcb.com/partdetail/C137102
pins: 1, 2
1 alternate drawing of the same symbol

## RC1210FR-0718KL
designator R?  Resistance: 18kΩ  (hidden comment: *)
Resistor, 18kΩ, ±1%, 500mW, 200V, ±100ppm/℃, -55℃~+155℃, SMD 1210; Manufacturer: Uniroyal; Manufacturer Part Number: RC1210FR-0718KL; Supplier 1: LCSC; Supplier Part Number 1: C728365; JLCPCB Part Number: C728365; Power Rating: 500mW; Category: Resistors; Package Size: 1210; JLCPCB Basic Part: Yes; Tolerance: ±1%; Voltage Rating: 200V; Temperature Coefficient: ±100ppm/℃; Temperature Rating: -55℃~+155℃; ComponentLink1Description: Datasheet; ComponentLink1URL: https://wmsc.lcsc.com/wmsc/upload/file/pdf/v2/lcsc/2304140030_YAGEO-RC1210FR-0718KL_C728365.pdf; ComponentLink2Description: JLCPCB Part URL; ComponentLink2URL: https://jlcpcb.com/partdetail/C728365
pins: 1, 2
1 alternate drawing of the same symbol

## RC1210FR-0718RL
designator R?  Resistance: 18Ω  (hidden comment: *)
Resistor, 18Ω, ±1%, 500mW, 200V, ±100ppm/℃, -55℃~+155℃, SMD 1210; Manufacturer: Uniroyal; Manufacturer Part Number: RC1210FR-0718RL; Supplier 1: LCSC; Supplier Part Number 1: C326797; JLCPCB Part Number: C326797; Power Rating: 500mW; Category: Resistors; Package Size: 1210; JLCPCB Basic Part: Yes; Tolerance: ±1%; Voltage Rating: 200V; Temperature Coefficient: ±100ppm/℃; Temperature Rating: -55℃~+155℃; ComponentLink1Description: Datasheet; ComponentLink1URL: https://wmsc.lcsc.com/wmsc/upload/file/pdf/v2/lcsc/1811141443_YAGEO-RC1210FR-0718RL_C326797.pdf; ComponentLink2Description: JLCPCB Part URL; ComponentLink2URL: https://jlcpcb.com/partdetail/C326797
pins: 1, 2
1 alternate drawing of the same symbol

## RC1210FR-0720KL
designator R?  Resistance: 20kΩ  (hidden comment: *)
Resistor, 20kΩ, ±1%, 500mW, 200V, ±100ppm/℃, -55℃~+155℃, SMD 1210; Manufacturer: Uniroyal; Manufacturer Part Number: RC1210FR-0720KL; Supplier 1: LCSC; Supplier Part Number 1: C728368; JLCPCB Part Number: C728368; Power Rating: 500mW; Category: Resistors; Package Size: 1210; JLCPCB Basic Part: Yes; Tolerance: ±1%; Voltage Rating: 200V; Temperature Coefficient: ±100ppm/℃; Temperature Rating: -55℃~+155℃; ComponentLink1Description: Datasheet; ComponentLink1URL: https://wmsc.lcsc.com/wmsc/upload/file/pdf/v2/lcsc/2304140030_YAGEO-RC1210FR-0720KL_C728368.pdf; ComponentLink2Description: JLCPCB Part URL; ComponentLink2URL: https://jlcpcb.com/partdetail/C728368
pins: 1, 2
1 alternate drawing of the same symbol

## RC1210FR-0720RL
designator R?  Resistance: 20Ω  (hidden comment: *)
Resistor, 20Ω, ±1%, 500mW, 200V, ±100ppm/℃, -55℃~+155℃, SMD 1210; Manufacturer: Uniroyal; Manufacturer Part Number: RC1210FR-0720RL; Supplier 1: LCSC; Supplier Part Number 1: C137100; JLCPCB Part Number: C137100; Power Rating: 500mW; Category: Resistors; Package Size: 1210; JLCPCB Basic Part: Yes; Tolerance: ±1%; Voltage Rating: 200V; Temperature Coefficient: ±100ppm/℃; Temperature Rating: -55℃~+155℃; ComponentLink1Description: Datasheet; ComponentLink1URL: https://wmsc.lcsc.com/wmsc/upload/file/pdf/v2/lcsc/2304140030_YAGEO-RC1210FR-0720RL_C137100.pdf; ComponentLink2Description: JLCPCB Part URL; ComponentLink2URL: https://jlcpcb.com/partdetail/C137100
pins: 1, 2
1 alternate drawing of the same symbol

## RC1210FR-0721RL
designator R?  Resistance: 21Ω  (hidden comment: *)
Resistor, 21Ω, ±1%, 500mW, 200V, ±100ppm/℃, -55℃~+155℃, SMD 1210; Manufacturer: Uniroyal; Manufacturer Part Number: RC1210FR-0721RL; Supplier 1: LCSC; Supplier Part Number 1: C728369; JLCPCB Part Number: C728369; Power Rating: 500mW; Category: Resistors; Package Size: 1210; JLCPCB Basic Part: Yes; Tolerance: ±1%; Voltage Rating: 200V; Temperature Coefficient: ±100ppm/℃; Temperature Rating: -55℃~+155℃; ComponentLink1Description: Datasheet; ComponentLink1URL: https://wmsc.lcsc.com/wmsc/upload/file/pdf/v2/lcsc/2304140030_YAGEO-RC1210FR-0721RL_C728369.pdf; ComponentLink2Description: JLCPCB Part URL; ComponentLink2URL: https://jlcpcb.com/partdetail/C728369
pins: 1, 2
1 alternate drawing of the same symbol

## RC1210FR-0722KL
designator R?  Resistance: 22kΩ  (hidden comment: *)
Resistor, 22kΩ, ±1%, 500mW, 200V, ±100ppm/℃, -55℃~+155℃, SMD 1210; Manufacturer: Uniroyal; Manufacturer Part Number: RC1210FR-0722KL; Supplier 1: LCSC; Supplier Part Number 1: C606192; JLCPCB Part Number: C606192; Power Rating: 500mW; Category: Resistors; Package Size: 1210; JLCPCB Basic Part: Yes; Tolerance: ±1%; Voltage Rating: 200V; Temperature Coefficient: ±100ppm/℃; Temperature Rating: -55℃~+155℃; ComponentLink1Description: Datasheet; ComponentLink1URL: https://wmsc.lcsc.com/wmsc/upload/file/pdf/v2/lcsc/2006112331_YAGEO-RC1210FR-0722KL_C606192.pdf; ComponentLink2Description: JLCPCB Part URL; ComponentLink2URL: https://jlcpcb.com/partdetail/C606192
pins: 1, 2
1 alternate drawing of the same symbol

## RC1210FR-0722RL
designator R?  Resistance: 22Ω  (hidden comment: *)
Resistor, 22Ω, ±1%, 500mW, 200V, ±100ppm/℃, -55℃~+155℃, SMD 1210; Manufacturer: Uniroyal; Manufacturer Part Number: RC1210FR-0722RL; Supplier 1: LCSC; Supplier Part Number 1: C723647; JLCPCB Part Number: C723647; Power Rating: 500mW; Category: Resistors; Package Size: 1210; JLCPCB Basic Part: Yes; Tolerance: ±1%; Voltage Rating: 200V; Temperature Coefficient: ±100ppm/℃; Temperature Rating: -55℃~+155℃; ComponentLink1Description: Datasheet; ComponentLink1URL: https://wmsc.lcsc.com/wmsc/upload/file/pdf/v2/lcsc/2008171335_YAGEO-RC1210FR-0722RL_C723647.pdf; ComponentLink2Description: JLCPCB Part URL; ComponentLink2URL: https://jlcpcb.com/partdetail/C723647
pins: 1, 2
1 alternate drawing of the same symbol

## RC1210FR-0727RL
designator R?  Resistance: 27Ω  (hidden comment: *)
Resistor, 27Ω, ±1%, 500mW, 200V, ±100ppm/℃, -55℃~+155℃, SMD 1210; Manufacturer: Uniroyal; Manufacturer Part Number: RC1210FR-0727RL; Supplier 1: LCSC; Supplier Part Number 1: C874875; JLCPCB Part Number: C874875; Power Rating: 500mW; Category: Resistors; Package Size: 1210; JLCPCB Basic Part: Yes; Tolerance: ±1%; Voltage Rating: 200V; Temperature Coefficient: ±100ppm/℃; Temperature Rating: -55℃~+155℃; ComponentLink1Description: Datasheet; ComponentLink1URL: https://wmsc.lcsc.com/wmsc/upload/file/pdf/v2/lcsc/2203031730_YAGEO-RC1210FR-0727RL_C874875.pdf; ComponentLink2Description: JLCPCB Part URL; ComponentLink2URL: https://jlcpcb.com/partdetail/C874875
pins: 1, 2
1 alternate drawing of the same symbol
